# Altium footprint library AltiumLibraries.PcbLib: 247 footprints (part 7 of 16)
Each footprint in its own frame and in the unit in brackets; x right, y up, seen from the top. Pads: shape width x height; smd on the part's side, far side on the other; paste and mask are expansions set on the pad; w line width, h text height; cw(c..) or ccw(c..) is an arc to the next point about the centre after c.
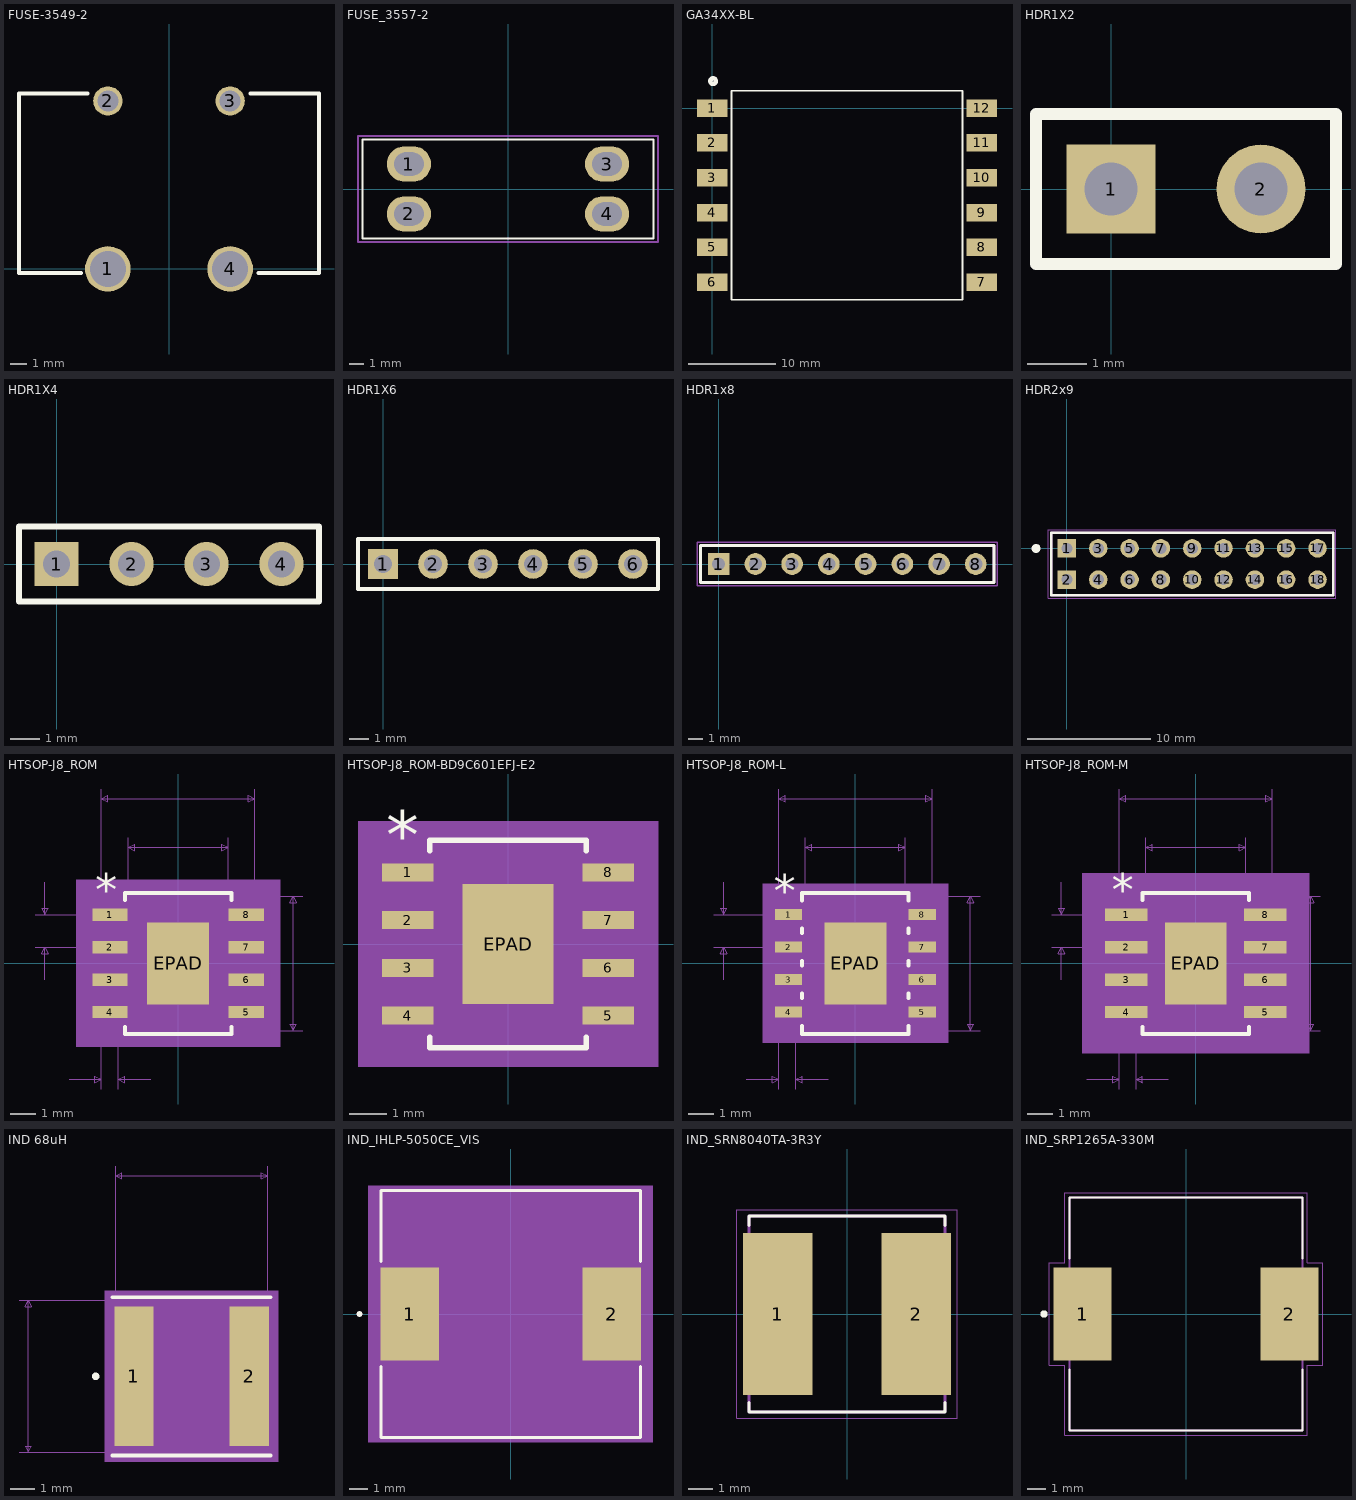
[diagram p6: the footprints below, top view; thin cyan lines are the x and y axes]

## FUSE-3549-2 [mm] "Keystone Miniblade FUSE_3549-2"
pads (4):
  round 2.8 hole 2.2: 1(-3.75,0) 4(3.75,0)
  round 1.8 hole 1.3: 2(-3.75,10.3) 3(3.75,10.3)
Top Overlay:
  lines w0.254: -5.4,-0.25 -9.2,-0.25 -9.2,10.75 -5,10.75 ; 4.999,10.75 9.2,10.75 9.2,-0.25 5.5,-0.25
3D body "keystone-PN3549-2.STEP": height 5.84, standoff -3.6, extent -9.135,-0.019 8.899,10.446

## FUSE_3557-2 [mm]
pads (4):
  oval 3x2.4 hole 1.6 slot 2 at 0 deg: 1(-6.735,1.7) 2(-6.735,-1.7) 3(6.735,1.7) 4(6.735,-1.7)
Top Overlay:
  lines w0.127: -9.905,-3.365 9.905,-3.365 9.905,3.365 -9.905,3.365 -9.905,-3.365
Mechanical 15:
  lines w0.127: -10.2,-3.6 -10.2,3.6 10.2,3.6 10.2,-3.6 -10.2,-3.6
3D body "keystone-PN3557-2.STEP": height 7.38, standoff -2.78, extent -9.948,-3.368 9.864,3.363

## GA34XX-BL [mm]
pads (12):
  rect 3.5x2 smd: 1(0,0) 2(0,-4) 3(0,-8) 4(0,-12) 5(0,-16) 6(0,-20) 7(30.95,-20) 8(30.95,-16) 9(30.95,-12) 10(30.95,-8) 11(30.95,-4) 12(30.95,0)
Top Overlay:
  circle w0.508: c0.1,3.1 r0.316
  lines w0.2: 2.21,-22 2.21,2 14.475,2 28.74,2 28.74,-22 2.21,-22
3D body "Coilcraft-GA3459-BL.STEP": height 14, standoff 0, extent -0.83,-23.385 31.83,3.385

## HDR1X2 [mm]
pads (2):
  rect 1.5x1.5 hole 0.9: 1(0,0)
  round 1.5 hole 0.9: 2(2.54,0)
Top Overlay:
  lines w0.2: -1.27,-1.27 -1.27,1.27 3.81,1.27 3.81,-1.27 -1.27,-1.27

## HDR1X4 [mm]
pads (4):
  rect 1.5x1.5 hole 0.9: 1(0,0)
  round 1.5 hole 0.9: 2(2.54,0) 3(5.08,0) 4(7.62,0)
Top Overlay:
  lines w0.2: -1.27,-1.27 -1.27,1.27 8.89,1.27 8.89,-1.27 -1.27,-1.27

## HDR1X6 [mm]
pads (6):
  rect 1.5x1.5 hole 0.9: 1(0,0)
  round 1.5 hole 0.9: 2(2.54,0) 3(5.08,0) 4(7.62,0) 5(10.16,0) 6(12.7,0)
Top Overlay:
  lines w0.2: -1.27,-1.27 13.97,-1.27 13.97,1.27 -1.27,1.27 -1.27,-1.27

## HDR1x8 [mm]
pads (8):
  rect 1.5x1.5 hole 0.9: 1(0,0)
  round 1.5 hole 0.9: 2(2.54,0) 3(5.08,0) 4(7.62,0) 5(10.16,0) 6(12.7,0) 7(15.24,0) 8(17.78,0)
Top Overlay:
  lines w0.2: -1.27,-1.27 -1.27,1.27 19.05,1.27 19.05,-1.27 -1.27,-1.27
Mechanical 13:
  lines w0.2: -1.27,-1.27 19.05,-1.27 19.05,1.27 -1.27,1.27 -1.27,-1.27
Mechanical 15:
  lines w0.1: -1.5,-1.5 19.25,-1.5 19.25,1.5 -1.5,1.5 -1.5,-1.5

## HDR2x9 [mm]
pads (18):
  rect 1.5x1.5 hole 0.9: 1(0,0) 2(0,-2.54)
  round 1.5 hole 0.9: 3(2.54,0) 4(2.54,-2.54) 5(5.08,0) 6(5.08,-2.54) 7(7.62,0) 8(7.62,-2.54) 9(10.16,0) 10(10.16,-2.54) 11(12.7,0) 12(12.7,-2.54) 13(15.24,0) 14(15.24,-2.54) 15(17.78,0) 16(17.78,-2.54) 17(20.32,0) 18(20.32,-2.54)
Top Overlay:
  circle w0.7: c-2.5,0 r0.01
  lines w0.2: -1.27,-3.81 -1.27,1.27 21.59,1.27 21.59,-3.81 -1.27,-3.81
Mechanical 13:
  lines w0.2: -1.27,-3.81 21.59,-3.81 21.59,1.27 -1.27,1.27 -1.27,-3.81
Mechanical 15:
  lines w0.1: 21.811,-4.04 -1.5,-4.04 -1.5,1.5 21.811,1.5 ; 21.82,-4.04 21.82,1.5

## HTSOP-J8_ROM [mil]
pads (9):
  rect 54x19 smd paste+0 mask+0: 1(-105,75) 2(-105,25) 3(-105,-25) 4(-105,-75) 5(105,-75) 6(105,-25) 7(105,25) 8(105,75)
  rect 95x126 smd paste-62.5 mask+0: EPAD(0,0)
Top Overlay:
  lines w6: -82,-97.6 -82,-108.5 82,-108.5 82,-97.6 ; -82,97.6 -82,108.5 82,108.5 82,97.6
  text "*" at -127.5,89 h50
Top Paste:
  region: 43.56,59.06 -43.56,59.06 -43.56,3.94 43.56,3.94
  region: 43.56,-3.94 -43.56,-3.94 -43.56,-59.06 43.56,-59.06
Mechanical 5:
  region: 157,-128.5 -157,-128.5 -157,128.5 157,128.5
Mechanical 7:
  lines w1: -220,25 -105,25 ; -220,75 -105,75 ; -205,-25 -205,25 ; -205,125 -205,75 ; -168,-178.5 -118,-178.5 ; -118,-193.5 -118,0 -118,268.5 ; -92,-193.5 -92,0 ; -77,0 -77,193.5 ; -42,-178.5 -92,-178.5 ; 0,-103.5 192,-103.5 ; 0,103.5 192,103.5 ; 77,0 77,193.5 ; 118,0 118,268.5 ; -205,25 -210,15 -200,15 -205,25 ; -205,75 -210,85 -200,85 -205,75 ; -118,-178.5 -128,-173.5 -128,-183.5 -118,-178.5 ; -118,253.5 118,253.5 ; -118,253.5 -108,258.5 -108,248.5 -118,253.5 ; -92,-178.5 -82,-173.5 -82,-183.5 -92,-178.5 ; -77,178.5 77,178.5 ; -77,178.5 -67,183.5 -67,173.5 -77,178.5 ; 77,178.5 67,183.5 67,173.5 77,178.5 ; 118,253.5 108,258.5 108,248.5 118,253.5 ; 177,-103.5 177,103.5 ; 177,-103.5 172,-93.5 182,-93.5 177,-103.5 ; 177,103.5 172,93.5 182,93.5 177,103.5
  text "Default Padstyle: RX54Y19D0T" at -350,-303.5 h50
  text "Pin One Padstyle: RX54Y19D0T" at -350,-363.5 h50
  text "Heat Tab Padstyle: RX95Y126D0T" at -375,-423.5 h50
  text "Alt 1 Padstyle: OX60Y90D30P" at -337.5,-543.5 h50
  text "Alt 2 Padstyle: OX90Y60D30P" at -337.5,-603.5 h50
  text "0.154in/3.912mm" at -93.75,198.5 h25
  text "0.236in/5.994mm" at -93.75,273.5 h25
  text "0.207in/5.258mm" at 197,-12.5 h25
  text "0.05in/1.27mm" at -387.5,37.5 h25
  text "0.026in/0.66mm" at -192.5,-223.5 h25
Mechanical 13:
  lines w0: -12,103.5 ccw(c0,103.5) 12,103.5
  lines w1: -118,-83.5 -118,-66.5 -77,-66.5 -77,-83.5 -118,-83.5 ; -118,-33.5 -118,-16.5 -77,-16.5 -77,-33.5 -118,-33.5 ; -118,16.5 -118,33.5 -77,33.5 -77,16.5 -118,16.5 ; -118,66.5 -118,83.5 -77,83.5 -77,66.5 -118,66.5 ; -77,-103.5 77,-103.5 77,103.5 -77,103.5 -77,-103.5 ; 77,-83.5 77,-66.5 118,-66.5 118,-83.5 77,-83.5 ; 77,-33.5 77,-16.5 118,-16.5 118,-33.5 77,-33.5 ; 77,16.5 77,33.5 118,33.5 118,16.5 77,16.5 ; 77,66.5 77,83.5 118,83.5 118,66.5 77,66.5
  text "*" at -74.5,50.5 h50
Mechanical 15:
  region: -87,-94.5 -142,-94.5 -142,94.5 -87,94.5 -87,113.5 87,113.5 87,94.5 142,94.5 142,-94.5 87,-94.5 87,-113.5 -87,-113.5
  lines w6: -142,-94.5 -142,94.5 -87,94.5 -87,113.5 87,113.5 87,94.5 142,94.5 142,-94.5 87,-94.5 87,-113.5 -87,-113.5 -87,-94.5 -142,-94.5
3D body: height 10, standoff 0, extent 0,0 10,10

## HTSOP-J8_ROM-BD9C601EFJ-E2 [mil]
pads (9):
  rect 54x19 smd paste+0 mask+0: 1(-105,75) 2(-105,25) 3(-105,-25) 4(-105,-75) 5(105,-75) 6(105,-25) 7(105,25) 8(105,75)
  rect 95x126 smd paste-62.5 mask+0: EPAD(0,0)
Top Overlay:
  lines w6: -82,-97.6 -82,-108.5 82,-108.5 82,-97.6 ; -82,97.6 -82,108.5 82,108.5 82,97.6
  text "*" at -127.5,89 h50
Top Paste:
  region: 43.56,-3.94 -43.56,-3.94 -43.56,-59.06 43.56,-59.06
  region: 43.56,59.06 -43.56,59.06 -43.56,3.94 43.56,3.94
Mechanical 5:
  region: 157,-128.5 -157,-128.5 -157,128.5 157,128.5
Mechanical 13:
  lines w0: -12,103.5 ccw(c0,103.5) 12,103.5
  lines w1: -118,-83.5 -77,-83.5 -77,-66.5 -118,-66.5 -118,-83.5 ; -118,-33.5 -77,-33.5 -77,-16.5 -118,-16.5 -118,-33.5 ; -118,16.5 -77,16.5 -77,33.5 -118,33.5 -118,16.5 ; -118,66.5 -77,66.5 -77,83.5 -118,83.5 -118,66.5 ; -77,-103.5 -77,103.5 77,103.5 77,-103.5 -77,-103.5 ; 77,-83.5 118,-83.5 118,-66.5 77,-66.5 77,-83.5 ; 77,-33.5 118,-33.5 118,-16.5 77,-16.5 77,-33.5 ; 77,16.5 118,16.5 118,33.5 77,33.5 77,16.5 ; 77,66.5 118,66.5 118,83.5 77,83.5 77,66.5
  text "*" at -74.5,50.5 h50
Mechanical 15:
  region: -87,-94.5 -142,-94.5 -142,94.5 -87,94.5 -87,113.5 87,113.5 87,94.5 142,94.5 142,-94.5 87,-94.5 87,-113.5 -87,-113.5
  lines w6: -142,-94.5 -87,-94.5 -87,-113.5 87,-113.5 87,-94.5 142,-94.5 142,94.5 87,94.5 87,113.5 -87,113.5 -87,94.5 -142,94.5 -142,-94.5
3D body "HTSOP-J8_ROM.step": height 39.09, standoff 0, extent -117.99,-103.5 117.99,103.5

## HTSOP-J8_ROM-L [mil]
pads (9):
  rect 42x17 smd paste+0 mask+0: 1(-103,75) 2(-103,25) 3(-103,-25) 4(-103,-75) 5(103,-75) 6(103,-25) 7(103,25) 8(103,75)
  rect 95x126 smd paste-62.5 mask+0: EPAD(0,0)
Top Overlay:
  lines w6: -82,-96.6 -82,-108.5 82,-108.5 82,-96.6 ; -82,-53.4 -82,-46.6 ; -82,-3.4 -82,3.4 ; -82,46.6 -82,53.4 ; -82,96.6 -82,108.5 82,108.5 82,96.6 ; 82,-53.4 82,-46.6 ; 82,-3.4 82,3.4 ; 82,46.6 82,53.4
  text "*" at -125.5,87 h50
Top Paste:
  region: 43.56,59.06 -43.56,59.06 -43.56,3.94 43.56,3.94
  region: 43.56,-3.94 -43.56,-3.94 -43.56,-59.06 43.56,-59.06
Mechanical 5:
  region: 143,-122.5 -143,-122.5 -143,122.5 143,122.5
Mechanical 7:
  lines w1: -218,25 -103,25 ; -218,75 -103,75 ; -203,-25 -203,25 ; -203,125 -203,75 ; -168,-178.5 -118,-178.5 ; -118,-193.5 -118,0 -118,268.5 ; -92,-193.5 -92,0 ; -77,0 -77,193.5 ; -42,-178.5 -92,-178.5 ; 0,-103.5 192,-103.5 ; 0,103.5 192,103.5 ; 77,0 77,193.5 ; 118,0 118,268.5 ; -203,25 -208,15 -198,15 -203,25 ; -203,75 -208,85 -198,85 -203,75 ; -118,-178.5 -128,-173.5 -128,-183.5 -118,-178.5 ; -118,253.5 118,253.5 ; -118,253.5 -108,258.5 -108,248.5 -118,253.5 ; -92,-178.5 -82,-173.5 -82,-183.5 -92,-178.5 ; -77,178.5 77,178.5 ; -77,178.5 -67,183.5 -67,173.5 -77,178.5 ; 77,178.5 67,183.5 67,173.5 77,178.5 ; 118,253.5 108,258.5 108,248.5 118,253.5 ; 177,-103.5 177,103.5 ; 177,-103.5 172,-93.5 182,-93.5 177,-103.5 ; 177,103.5 172,93.5 182,93.5 177,103.5
  text "Default Padstyle: RX42Y17D0T" at -350,-303.5 h50
  text "Pin One Padstyle: RX42Y17D0T" at -350,-363.5 h50
  text "Heat Tab Padstyle: RX95Y126D0T" at -375,-423.5 h50
  text "Alt 1 Padstyle: OX60Y90D30P" at -337.5,-543.5 h50
  text "Alt 2 Padstyle: OX90Y60D30P" at -337.5,-603.5 h50
  text "0.154in/3.912mm" at -93.75,198.5 h25
  text "0.236in/5.994mm" at -93.75,273.5 h25
  text "0.207in/5.258mm" at 197,-12.5 h25
  text "0.05in/1.27mm" at -385.5,37.5 h25
  text "0.026in/0.66mm" at -192.5,-223.5 h25
Mechanical 13:
  lines w0: -12,103.5 ccw(c0,103.5) 12,103.5
  lines w1: -118,-83.5 -118,-66.5 -77,-66.5 -77,-83.5 -118,-83.5 ; -118,-33.5 -118,-16.5 -77,-16.5 -77,-33.5 -118,-33.5 ; -118,16.5 -118,33.5 -77,33.5 -77,16.5 -118,16.5 ; -118,66.5 -118,83.5 -77,83.5 -77,66.5 -118,66.5 ; -77,-103.5 77,-103.5 77,103.5 -77,103.5 -77,-103.5 ; 77,-83.5 77,-66.5 118,-66.5 118,-83.5 77,-83.5 ; 77,-33.5 77,-16.5 118,-16.5 118,-33.5 77,-33.5 ; 77,16.5 77,33.5 118,33.5 118,16.5 77,16.5 ; 77,66.5 77,83.5 118,83.5 118,66.5 77,66.5
  text "*" at -74.5,50.5 h50
Mechanical 15:
  region: -81,-87.5 -128,-87.5 -128,87.5 -81,87.5 -81,107.5 81,107.5 81,87.5 128,87.5 128,-87.5 81,-87.5 81,-107.5 -81,-107.5
  lines w6: -128,-87.5 -128,87.5 -81,87.5 -81,107.5 81,107.5 81,87.5 128,87.5 128,-87.5 81,-87.5 81,-107.5 -81,-107.5 -81,-87.5 -128,-87.5
3D body: height 10, standoff 0, extent 0,0 10,10

## HTSOP-J8_ROM-M [mil]
pads (9):
  rect 66x19 smd paste+0 mask+0: 1(-107,75) 2(-107,25) 3(-107,-25) 4(-107,-75) 5(107,-75) 6(107,-25) 7(107,25) 8(107,75)
  rect 95x126 smd paste-62.5 mask+0: EPAD(0,0)
Top Overlay:
  lines w6: -82,-97.6 -82,-108.5 82,-108.5 82,-97.6 ; -82,97.6 -82,108.5 82,108.5 82,97.6
  text "*" at -129.5,89 h50
Top Paste:
  region: 43.56,59.06 -43.56,59.06 -43.56,3.94 43.56,3.94
  region: 43.56,-3.94 -43.56,-3.94 -43.56,-59.06 43.56,-59.06
Mechanical 5:
  region: 175,-138.5 -175,-138.5 -175,138.5 175,138.5
Mechanical 7:
  lines w1: -222,25 -107,25 ; -222,75 -107,75 ; -207,-25 -207,25 ; -207,125 -207,75 ; -168,-178.5 -118,-178.5 ; -118,-193.5 -118,0 -118,268.5 ; -92,-193.5 -92,0 ; -77,0 -77,193.5 ; -42,-178.5 -92,-178.5 ; 0,-103.5 192,-103.5 ; 0,103.5 192,103.5 ; 77,0 77,193.5 ; 118,0 118,268.5 ; -207,25 -212,15 -202,15 -207,25 ; -207,75 -212,85 -202,85 -207,75 ; -118,-178.5 -128,-173.5 -128,-183.5 -118,-178.5 ; -118,253.5 118,253.5 ; -118,253.5 -108,258.5 -108,248.5 -118,253.5 ; -92,-178.5 -82,-173.5 -82,-183.5 -92,-178.5 ; -77,178.5 77,178.5 ; -77,178.5 -67,183.5 -67,173.5 -77,178.5 ; 77,178.5 67,183.5 67,173.5 77,178.5 ; 118,253.5 108,258.5 108,248.5 118,253.5 ; 177,-103.5 177,103.5 ; 177,-103.5 172,-93.5 182,-93.5 177,-103.5 ; 177,103.5 172,93.5 182,93.5 177,103.5
  text "Default Padstyle: RX66Y19D0T" at -350,-303.5 h50
  text "Pin One Padstyle: RX66Y19D0T" at -350,-363.5 h50
  text "Heat Tab Padstyle: RX95Y126D0T" at -375,-423.5 h50
  text "Alt 1 Padstyle: OX60Y90D30P" at -337.5,-543.5 h50
  text "Alt 2 Padstyle: OX90Y60D30P" at -337.5,-603.5 h50
  text "0.154in/3.912mm" at -93.75,198.5 h25
  text "0.236in/5.994mm" at -93.75,273.5 h25
  text "0.207in/5.258mm" at 197,-12.5 h25
  text "0.05in/1.27mm" at -389.5,37.5 h25
  text "0.026in/0.66mm" at -192.5,-223.5 h25
Mechanical 13:
  lines w0: -12,103.5 ccw(c0,103.5) 12,103.5
  lines w1: -118,-83.5 -118,-66.5 -77,-66.5 -77,-83.5 -118,-83.5 ; -118,-33.5 -118,-16.5 -77,-16.5 -77,-33.5 -118,-33.5 ; -118,16.5 -118,33.5 -77,33.5 -77,16.5 -118,16.5 ; -118,66.5 -118,83.5 -77,83.5 -77,66.5 -118,66.5 ; -77,-103.5 77,-103.5 77,103.5 -77,103.5 -77,-103.5 ; 77,-83.5 77,-66.5 118,-66.5 118,-83.5 77,-83.5 ; 77,-33.5 77,-16.5 118,-16.5 118,-33.5 77,-33.5 ; 77,16.5 77,33.5 118,33.5 118,16.5 77,16.5 ; 77,66.5 77,83.5 118,83.5 118,66.5 77,66.5
  text "*" at -74.5,50.5 h50
Mechanical 15:
  region: -97,-104.5 -160,-104.5 -160,104.5 -97,104.5 -97,123.5 97,123.5 97,104.5 160,104.5 160,-104.5 97,-104.5 97,-123.5 -97,-123.5
  lines w6: -160,-104.5 -160,104.5 -97,104.5 -97,123.5 97,123.5 97,104.5 160,104.5 160,-104.5 97,-104.5 97,-123.5 -97,-123.5 -97,-104.5 -160,-104.5
3D body: height 10, standoff 0, extent 0,0 10,10

## IND 68uH [mil]
pads (2):
  rect 63x224 smd paste+0 mask+0: 1(902.5,385) 2(1087.5,385)
Top Overlay:
  circle w6: c841,385 r3
  lines w6: 868,258 1122,258 ; 868,512 1122,512
Mechanical 5:
  region: 1134,248 856,248 856,522 1134,522
Mechanical 7:
  lines w1: 718,263 1127,263 ; 718,507 1127,507 ; 873,507 873,722 ; 1117,507 1117,722 ; 733,263 733,507 ; 733,263 728,273 738,273 733,263 ; 733,507 728,497 738,497 733,507 ; 873,707 1117,707 ; 873,707 883,712 883,702 873,707 ; 1117,707 1107,712 1107,702 1117,707
  text "Default Pad Style: RX63Y224D0T" at 620,53 h50
  text "Alt 1 Pad Style: OX60Y90D30P" at 645,3 h50
  text "Alt 2 Pad Style: EX90Y60D30P" at 645,-47 h50
  text "0.244in/6.198mm" at 901.25,727 h25
  text "0.244in/6.198mm" at 525.5,372.5 h25
Mechanical 13:
  circle w0: c876,385 r3
  lines w1: 873,263 1117,263 1117,507 873,507 873,263
Mechanical 15:
  region: 863,263 861,263 861,507 863,507 863,517 1127,517 1127,507 1129,507 1129,263 1127,263 1127,253 863,253
  lines w6: 861,263 861,507 863,507 863,517 1127,517 1127,507 1129,507 1129,263 1127,263 1127,253 863,253 863,263 861,263
3D body "IND_TAIYO_NR6028_TAY.step": height 110, standoff 0, extent 873,262.92 1117.01,507.09
3D body: height 10, standoff 0, extent 995,385 1005,395

## IND_IHLP-5050CE_VIS [mil]
pads (2):
  rect 123x195 smd paste+0 mask+0: 1(-212,0) 2(212,0)
Top Overlay:
  circle w6: c-317.5,0 r3
  lines w6: -272.5,-110.6 -272.5,-259 272.5,-259 272.5,-110.6 ; -272.5,110.6 -272.5,259 272.5,259 272.5,110.6
Mechanical 5:
  region: 298.5,-269 -298.5,-269 -298.5,269 298.5,269
Mechanical 13:
  circle w0: c-247.5,0 r3
  lines w1: -267.5,-254 -267.5,254 267.5,254 267.5,-254 -267.5,-254
Mechanical 15:
  region: -277.5,-107.5 -283.5,-107.5 -283.5,107.5 -277.5,107.5 -277.5,264 277.5,264 277.5,107.5 283.5,107.5 283.5,-107.5 277.5,-107.5 277.5,-264 -277.5,-264
  lines w6: -283.5,-107.5 -277.5,-107.5 -277.5,-264 277.5,-264 277.5,-107.5 283.5,-107.5 283.5,107.5 277.5,107.5 277.5,264 -277.5,264 -277.5,107.5 -283.5,107.5 -283.5,-107.5
3D body: height 10, standoff 0, extent 0,0 10,10
3D body "IND_IHLP-5050CE_VIS.step": height 140, standoff 0, extent -267.48,-254.02 267.48,254.02

## IND_SRN8040TA-3R3Y [mm]
pads (2):
  rect 2.85x6.6 smd: 1(-2.825,0) 2(2.825,0)
Top Overlay:
  lines w0.127: -4,-3.615 -4,-4 4,-4 4,-3.615 ; -4,3.615 -4,4 4,4 4,3.615
Mechanical 13:
  lines w0.127: -4,-4 4,-4 4,4 -4,4 -4,-4
Mechanical 15:
  lines w0.05: -4.5,-4.25 -4.5,4.25 4.5,4.25 4.5,-4.25 -4.5,-4.25

## IND_SRP1265A-330M [mm]
pads (2):
  rect 3.1x5 smd: 1(-5.55,0) 2(5.55,0)
Top Overlay:
  circle w0.2: c-7.62,0 r0.1
  lines w0.127: -6.25,-3 -6.25,-6.25 6.25,-6.25 6.25,-3 ; -6.25,3 -6.25,6.25 6.25,6.25 6.25,3
Mechanical 13:
  lines w0.127: -6.25,-6.25 6.25,-6.25 6.25,6.25 -6.25,6.25 -6.25,-6.25
Mechanical 15:
  lines w0.05: -7.35,-2.75 -6.5,-2.75 -6.5,-6.5 6.5,-6.5 6.5,-2.75 7.35,-2.75 7.35,2.75 6.5,2.75 6.5,6.5 -6.5,6.5 -6.5,2.75 -7.35,2.75 -7.35,-2.75
3D body "IND_IHLP-5050CE_VIS.step": height 3.56, standoff 0, extent -6.794,-6.452 6.794,6.452